# Altium footprint library FCI THD.PcbLib: 30 footprints (part 1 of 2) (continued)
## FCI_87606-310LF [mm] "20 Contacts - Pitch 2.54mm - Top Entry, Dual Row Through Mount Receptacle"
height 8.5
pads (20):
  round 1.6 hole 0.9: 1(-11.43,1.27) 2(-11.43,-1.27) 3(-8.89,1.27) 4(-8.89,-1.27) 5(-6.35,1.27) 6(-6.35,-1.27) 7(-3.81,1.27) 8(-3.81,-1.27) 9(-1.27,1.27) 10(-1.27,-1.27) 11(1.27,1.27) 12(1.27,-1.27) 13(3.81,1.27) 14(3.81,-1.27) 15(6.35,1.27) 16(6.35,-1.27) 17(8.89,1.27) 18(8.89,-1.27) 19(11.43,1.27) 20(11.43,-1.27)
Top Overlay:
  circle w0.3: c-11.357,3.048 r0.15
  lines w0.2: -12.66,-2.54 -12.66,2.54 12.66,2.54 12.66,-2.54 -12.66,-2.54
  text "20" at 13.081,-1.651 h1.02
  text "1" at -13.462,0.762 h1.02
Mechanical 14:
  drawing of 244 lines, arcs and shapes, not listed
  text "20" at 13.081,-1.651 h1.02
  text "1" at -13.462,0.762 h1.02
3D body "FCI_87606-310LF.stp": height 8.5, standoff -2.9, extent -12.7,-2.54 12.7,2.54

## FCI_87606-313LF [mm] "26 Contacts - Pitch 2.54mm - Top Entry, Dual Row Through Mount Receptacle"
height 8.5
pads (26):
  round 1.6 hole 0.9: 1(-15.24,1.27) 2(-15.24,-1.27) 3(-12.7,1.27) 4(-12.7,-1.27) 5(-10.16,1.27) 6(-10.16,-1.27) 7(-7.62,1.27) 8(-7.62,-1.27) 9(-5.08,1.27) 10(-5.08,-1.27) 11(-2.54,1.27) 12(-2.54,-1.27) 13(0,1.27) 14(0,-1.27) 15(2.54,1.27) 16(2.54,-1.27) 17(5.08,1.27) 18(5.08,-1.27) 19(7.62,1.27) 20(7.62,-1.27) 21(10.16,1.27) 22(10.16,-1.27) 23(12.7,1.27) 24(12.7,-1.27) 25(15.24,1.27) 26(15.24,-1.27)
Top Overlay:
  circle w0.3: c-15.167,3.048 r0.15
  lines w0.2: -16.47,-2.54 -16.47,2.54 16.47,2.54 16.47,-2.54 -16.47,-2.54
  text "26" at 16.891,-1.651 h1.02
  text "1" at -17.272,0.762 h1.02
Mechanical 14:
  drawing of 316 lines, arcs and shapes, not listed
  text "1" at -17.272,0.762 h1.02
  text "26" at 16.891,-1.651 h1.02
3D body "FCI_87606-313LF.stp": height 8.5, standoff -2.9, extent -16.51,-2.54 16.51,2.54

## FCI_87606-317LF [mm] "34 Contacts - Pitch 2.54mm - Top Entry, Dual Row Through Mount Receptacle"
height 8.5
pads (34):
  round 1.6 hole 0.9: 1(-20.32,1.27) 2(-20.32,-1.27) 3(-17.78,1.27) 4(-17.78,-1.27) 5(-15.24,1.27) 6(-15.24,-1.27) 7(-12.7,1.27) 8(-12.7,-1.27) 9(-10.16,1.27) 10(-10.16,-1.27) 11(-7.62,1.27) 12(-7.62,-1.27) 13(-5.08,1.27) 14(-5.08,-1.27) 15(-2.54,1.27) 16(-2.54,-1.27) 17(0,1.27) 18(0,-1.27) 19(2.54,1.27) 20(2.54,-1.27) 21(5.08,1.27) 22(5.08,-1.27) 23(7.62,1.27) 24(7.62,-1.27) 25(10.16,1.27) 26(10.16,-1.27) 27(12.7,1.27) 28(12.7,-1.27) 29(15.24,1.27) 30(15.24,-1.27) 31(17.78,1.27) 32(17.78,-1.27) 33(20.32,1.27) 34(20.32,-1.27)
Top Overlay:
  circle w0.3: c-20.247,3.048 r0.15
  lines w0.2: -21.55,-2.54 21.55,-2.54 21.55,2.54 -21.55,2.54 -21.55,-2.54
  text "34" at 21.971,-1.651 h1.02
  text "1" at -22.352,0.762 h1.02
Mechanical 14:
  drawing of 413 lines, arcs and shapes, not listed
  text "34" at 21.971,-1.651 h1.02
  text "1" at -22.352,0.762 h1.02
3D body "FCI_87606-317LF.stp": height 8.5, standoff -2.9, extent -21.59,-2.54 21.59,2.54

## FCI_87606-320LF [mm] "40 Contacts - Pitch 2.54mm - Top Entry, Dual Row Through Mount Receptacle"
height 8.5
pads (40):
  round 1.6 hole 0.9: 1(-24.13,1.27) 2(-24.13,-1.27) 3(-21.59,1.27) 4(-21.59,-1.27) 5(-19.05,1.27) 6(-19.05,-1.27) 7(-16.51,1.27) 8(-16.51,-1.27) 9(-13.97,1.27) 10(-13.97,-1.27) 11(-11.43,1.27) 12(-11.43,-1.27) 13(-8.89,1.27) 14(-8.89,-1.27) 15(-6.35,1.27) 16(-6.35,-1.27) 17(-3.81,1.27) 18(-3.81,-1.27) 19(-1.27,1.27) 20(-1.27,-1.27) 21(1.27,1.27) 22(1.27,-1.27) 23(3.81,1.27) 24(3.81,-1.27) 25(6.35,1.27) 26(6.35,-1.27) 27(8.89,1.27) 28(8.89,-1.27) 29(11.43,1.27) 30(11.43,-1.27) 31(13.97,1.27) 32(13.97,-1.27) 33(16.51,1.27) 34(16.51,-1.27) 35(19.05,1.27) 36(19.05,-1.27) 37(21.59,1.27) 38(21.59,-1.27) 39(24.13,1.27) 40(24.13,-1.27)
Top Overlay:
  circle w0.3: c-24.057,3.048 r0.15
  lines w0.2: -25.36,-2.54 25.36,-2.54 25.36,2.54 -25.36,2.54 -25.36,-2.54
  text "1" at -26.162,0.762 h1.02
  text "40" at 25.781,-1.651 h1.02
Mechanical 14:
  drawing of 485 lines, arcs and shapes, not listed
  text "1" at -26.162,0.762 h1.02
  text "40" at 25.781,-1.651 h1.02
3D body "FCI_87606-320LF.stp": height 8.5, standoff -2.9, extent -25.4,-2.54 25.4,2.54

## FCI_87606-325LF [mm] "50 Contacts - Pitch 2.54mm - Top Entry, Dual Row Through Mount Receptacle"
height 8.5
pads (50):
  round 1.6 hole 0.9: 1(-30.48,1.27) 2(-30.48,-1.27) 3(-27.94,1.27) 4(-27.94,-1.27) 5(-25.4,1.27) 6(-25.4,-1.27) 7(-22.86,1.27) 8(-22.86,-1.27) 9(-20.32,1.27) 10(-20.32,-1.27) 11(-17.78,1.27) 12(-17.78,-1.27) 13(-15.24,1.27) 14(-15.24,-1.27) 15(-12.7,1.27) 16(-12.7,-1.27) 17(-10.16,1.27) 18(-10.16,-1.27) 19(-7.62,1.27) 20(-7.62,-1.27) 21(-5.08,1.27) 22(-5.08,-1.27) 23(-2.54,1.27) 24(-2.54,-1.27) 25(0,1.27) 26(0,-1.27) 27(2.54,1.27) 28(2.54,-1.27) 29(5.08,1.27) 30(5.08,-1.27) 31(7.62,1.27) 32(7.62,-1.27) 33(10.16,1.27) 34(10.16,-1.27) 35(12.7,1.27) 36(12.7,-1.27) 37(15.24,1.27) 38(15.24,-1.27) 39(17.78,1.27) 40(17.78,-1.27) 41(20.32,1.27) 42(20.32,-1.27) 43(22.86,1.27) 44(22.86,-1.27) 45(25.4,1.27) 46(25.4,-1.27) 47(27.94,1.27) 48(27.94,-1.27) 49(30.48,1.27) 50(30.48,-1.27)
Top Overlay:
  circle w0.3: c-30.407,3.048 r0.15
  lines w0.2: -31.71,-2.54 31.71,-2.54 31.71,2.54 -31.71,2.54 -31.71,-2.54
  text "1" at -32.512,0.762 h1.02
  text "50" at 32.131,-1.651 h1.02
Mechanical 14:
  drawing of 605 lines, arcs and shapes, not listed
  text "50" at 32.131,-1.651 h1.02
  text "1" at -32.512,0.761 h1.02
3D body "FCI_87606-325LF.stp": height 8.5, standoff -2.9, extent -31.85,-2.54 31.85,2.54

## FCI_95678-001LF [mm] "1 Port, 8 Positions Shielded Snap PEG, CAT5 RJ45 Horizontal Modular Jack"
height 13.99
pads (12):
  round 1.6 hole 0.9: 1(4.445,1.27) 2(3.175,-1.27) 3(1.905,1.27) 4(0.635,-1.27) 5(-0.635,1.27) 6(-1.905,-1.27) 7(-3.171,1.27) 8(-4.445,-1.27)
  round 1 hole 3.25 unplated mask+1.125: M1(-5.715,7.62) M2(5.715,7.62)
  round 2.3 hole 1.6: SHIELD(-7.745,10.67) SHIELD(7.745,10.67)
Top Overlay:
  lines w0.2: -8.17,9.231 -8.17,-3.35 8.17,-3.35 8.17,9.231 ; -8.17,12.109 -8.17,18.35 8.17,18.35 8.17,12.109 ; -1.27,15.586 1.27,15.586 ; -1.27,17.759 1.27,17.759 ; -1.27,18.35 -1.27,15.48 1.27,15.48 1.27,18.35
  text "1" at 6.03,0.6 h1.2
Mechanical 8:
  circle w0.05: c7.745,10.67 r1.15
  circle w0.05: c-7.745,10.67 r1.15
  circle w0.05: c3.175,-1.27 r0.8
  circle w0.05: c4.445,1.27 r0.8
  circle w0.05: c1.905,1.27 r0.8
  circle w0.05: c0.635,-1.27 r0.8
  circle w0.05: c-1.905,-1.27 r0.8
  circle w0.05: c-0.635,1.27 r0.8
  circle w0.05: c-3.175,1.27 r0.8
  circle w0.05: c-4.445,-1.27 r0.8
  circle w0.05: c4.445,1.27 r0.45
  circle w0.05: c1.905,1.27 r0.45
  circle w0.05: c3.175,-1.27 r0.45
  circle w0.05: c-0.635,1.27 r0.45
  circle w0.05: c0.635,-1.27 r0.45
  circle w0.05: c-3.175,1.27 r0.45
  circle w0.05: c-1.905,-1.27 r0.45
  circle w0.05: c-4.445,-1.27 r0.45
  circle w0.05: c-7.745,10.67 r0.8
  circle w0.05: c7.745,10.67 r0.8
  circle w0.05: c-5.715,7.62 r1.625
  circle w0.05: c5.715,7.62 r1.625
  lines w0.05: -7.745,11.17 -7.745,10.67 -7.245,10.67 ; -5.715,8.12 -5.715,7.62 -5.215,7.62 ; -4.445,-0.77 -4.445,-1.27 -3.945,-1.27 ; -3.175,1.77 -3.175,1.27 -2.675,1.27 ; -1.905,-0.77 -1.905,-1.27 -1.405,-1.27 ; -0.635,1.77 -0.635,1.27 -0.135,1.27 ; -0.5,0 0,0 ; 0,-0.5 0,0 ; 0,0.5 0,0 ; 0.5,0 0,0 ; 0.635,-0.77 0.635,-1.27 1.135,-1.27 ; 1.905,1.77 1.905,1.27 2.405,1.27 ; 3.175,-0.77 3.175,-1.27 3.675,-1.27 ; 4.445,1.77 4.445,1.27 4.945,1.27 ; 5.715,8.12 5.715,7.62 6.215,7.62 ; 7.745,11.17 7.745,10.67 8.245,10.67
Mechanical 14:
  lines w0.1: -1.27,15.586 1.27,15.586 ; -1.27,17.759 1.27,17.759 ; -1.27,18.35 -1.27,15.48 1.27,15.48 1.27,18.35 ; -8.17,-3.35 8.17,-3.35 8.17,18.35 -8.17,18.35 -8.17,-3.35
  text "1" at 6.03,0.6 h1.2
3D body "FCI_95678-001LF.stp": height 15.27, standoff -4.06, extent -8.17,-3.35 8.17,18.35

## FCI_10074141-001LF [mm] "1.27mm (.050\") Pitch, eSATA Right-Angle, Upright Plug, Through-Hole Solder"
height 19.6
pads (11):
  round 1.1 hole 0.75: 1(0.5,-1.79) 2(-0.5,-0.52) 3(-0.5,0.75) 4(0.5,2.02) 5(-0.5,3.29) 6(-0.5,4.56) 7(0.5,5.83)
  round 2.05 hole 1.7: 8(-2.2,-3.75) 8(-2.2,3.75) 8(2.2,-3.75) 8(2.2,3.75)
Top Overlay:
  lines w0.2: -3.853,-12.9 -2.493,-12.9 ccw(c-2.619,-12.321) -2.04,-12.447 -2.04,-12.287 ; -3.293,-7.8 -3.293,-4.624 ; -3.293,-7.593 -2.333,-7.593 ; -3.293,-6.287 -2.333,-6.287 ; -3.293,-2.876 -3.293,2.723 ; -3.293,4.777 -3.293,7.02 3.293,7.02 3.293,4.777 ; -2.653,-12.9 -2.653,-13.3 -3.853,-13.3 -3.853,-12.58 -2.493,-12.58 ccw(c-2.493,-12.42) -2.333,-12.42 -2.333,-5.144 ; -2.333,-12.287 -1.907,-12.287 cw(c-1.907,-12.447) -1.747,-12.447 ; -2.333,-10.927 -2.561,-10.813 -2.333,-10.5 ; -2.333,-2.356 -2.333,2.256 ; -2.333,5.244 -2.333,7.02 ; -1.747,-12.447 -1.747,-12.9 1.747,-12.9 1.747,-12.447 ; 1.747,-12.447 cw(c1.907,-12.447) 1.907,-12.287 2.333,-12.287 ; 2.04,-12.287 2.04,-12.447 ccw(c2.619,-12.321) 2.493,-12.9 3.853,-12.9 ; 2.333,-10.927 2.561,-10.813 2.333,-10.5 ; 2.333,-7.593 3.293,-7.593 ; 2.333,-6.287 3.293,-6.287 ; 2.333,-5.244 2.333,-12.42 ccw(c2.493,-12.42) 2.493,-12.58 3.853,-12.58 3.853,-13.3 2.653,-13.3 2.653,-12.9 ; 2.333,-2.256 2.333,2.256 ; 2.333,5.244 2.333,7.02 ; 3.293,-7.8 3.293,-4.777 ; 3.293,-2.723 3.293,2.723 ; -3.293,-7.807 -2.333,-7.807 -3.293,-7.807 ; 2.333,-7.807 3.293,-7.807 2.333,-7.807
Mechanical 8:
  lines w0.1: -2.7,-3.75 -2.2,-3.75 ; -2.7,3.75 -2.2,3.75 ; -2.2,-4.25 -2.2,-3.75 ; -2.2,-3.25 -2.2,-3.75 ; -2.2,3.25 -2.2,3.75 ; -2.2,4.25 -2.2,3.75 ; -1.7,-3.75 -2.2,-3.75 ; -1.7,3.75 -2.2,3.75 ; -1,-0.52 -0.5,-0.52 -0.5,-1.02 ; -1,0.75 -0.5,0.75 -0.5,1.25 ; -1,3.29 -0.5,3.29 -0.5,3.79 ; -1,4.56 -0.5,4.56 -0.5,5.06 ; -0.5,0 0,0 ; 0,-0.5 0,0 ; 0,0.5 0,0 ; 0,5.83 0.5,5.83 0.5,6.33 ; 0.5,-2.29 0.5,-1.79 1,-1.79 ; 0.5,0 0,0 ; 0.5,1.52 0.5,2.02 1,2.02 ; 1.7,-3.75 2.2,-3.75 ; 1.7,3.75 2.2,3.75 ; 2.2,-4.25 2.2,-3.75 ; 2.2,-3.25 2.2,-3.75 ; 2.2,3.25 2.2,3.75 ; 2.2,4.25 2.2,3.75 ; 2.7,-3.75 2.2,-3.75 ; 2.7,3.75 2.2,3.75
Mechanical 14:
  lines w0.1: -3.853,-12.9 -2.493,-12.9 ccw(c-2.619,-12.321) -2.04,-12.447 -2.04,-12.287 ; -3.293,-7.807 -2.333,-7.807 ; -3.293,-7.8 -3.293,7.02 3.293,7.02 3.293,-7.8 ; -3.293,-7.593 -2.333,-7.593 ; -3.293,-6.287 -2.333,-6.287 ; -2.653,-12.9 -2.653,-13.3 -3.853,-13.3 -3.853,-12.58 -2.493,-12.58 ccw(c-2.493,-12.42) -2.333,-12.42 -2.333,7.02 ; -2.333,-12.287 -1.907,-12.287 cw(c-1.907,-12.447) -1.747,-12.447 ; -2.333,-10.927 -2.561,-10.813 -2.333,-10.5 ; -1.747,-12.447 -1.747,-12.9 1.747,-12.9 1.747,-12.447 ; 1.747,-12.447 cw(c1.907,-12.447) 1.907,-12.287 2.333,-12.287 ; 2.04,-12.287 2.04,-12.447 ccw(c2.619,-12.321) 2.493,-12.9 3.853,-12.9 ; 2.333,-10.927 2.561,-10.813 2.333,-10.5 ; 2.333,-7.807 3.293,-7.807 ; 2.333,-7.593 3.293,-7.593 ; 2.333,-6.287 3.293,-6.287 ; 2.333,7.02 2.333,-12.42 ccw(c2.493,-12.42) 2.493,-12.58 3.853,-12.58 3.853,-13.3 2.653,-13.3 2.653,-12.9
3D body "FCI_10074141-001LF.stp": height 19.15, standoff -2.91, extent -3.85,-13.25 3.85,7.02

## FCI_20020110-D041A01LF [mm] "10A, 300V, 4 Positions, Pitch 3.81mm, Right Angled Terminal Block"
height 7.5
pads (4):
  round 2.1 hole 1.4: 1(-5.715,0) 2(-1.905,0) 3(1.905,0) 4(5.715,0)
Top Overlay:
  circle w0.5: c-5.725,2.3 r0.25
  lines w0.2: -8.115,-7.8 -8.115,1.4 8.115,1.4 8.115,-7.8 ; -8.115,-5.4 -8.215,-5.4 -8.215,-7.8 8.215,-7.8 8.215,-5.4 8.115,-5.4
  text "1" at -5.985,-2.975 h1.2
Mechanical 8:
  lines w0.1: -6.215,0 -5.715,0 ; -5.715,-0.5 -5.715,0 ; -5.715,0.5 -5.715,0 ; -5.215,0 -5.715,0 ; -2.405,0 -1.905,0 ; -1.905,-0.5 -1.905,0 ; -1.905,0.5 -1.905,0 ; -1.405,0 -1.905,0 ; -0.5,0 0,0 ; 0,-0.5 0,0 ; 0,0.5 0,0 ; 0.5,0 0,0 ; 1.405,0 1.905,0 ; 1.905,-0.5 1.905,0 ; 1.905,0.5 1.905,0 ; 2.405,0 1.905,0 ; 5.215,0 5.715,0 ; 5.715,-0.5 5.715,0 ; 5.715,0.5 5.715,0 ; 6.215,0 5.715,0
Mechanical 14:
  lines w0.1: -8.115,-7.8 -8.115,1.4 8.115,1.4 8.115,-7.8 ; -8.115,-5.4 -8.215,-5.4 -8.215,-7.8 8.215,-7.8 8.215,-5.4 8.115,-5.4
  text "1" at -5.985,-2.975 h1.2
3D body "FCI_20020110-D041A01LF.stp": height 7.6, standoff -3.52, extent -8.215,-7.8 8.215,1.4

## FCI_20021311-00010T4LF [mm] "10 Contacts, Pitch 1.27mm, Board-To-Board Connector, THD Vertical Receptacle, Minitek127 20021311 Series"
height 4.4
pads (10):
  rrect50% 1.05x1.05 hole 0.6: 1(-2.54,-0.635) 2(-2.54,0.635) 3(-1.27,-0.635) 4(-1.27,0.635) 5(0,-0.635) 6(0,0.635) 7(1.27,-0.635) 8(1.27,0.635) 9(2.54,-0.635) 10(2.54,0.635)
Top Overlay:
  circle w0.25: c-2.575,-1.975 r0.125
  lines w0.2: -3.41,1.5 -3.135,1.5 ; -3.4,-1.237 -3.4,-1.5 -3.135,-1.5 ; -3.4,1.237 -3.4,1.5 ; 3.135,-1.5 3.4,-1.5 ; 3.135,1.5 3.41,1.5 3.41,1.223 ; 3.41,-1.5 3.41,-1.223
Mechanical 8:
  lines w0.05: -3.04,-0.635 -2.54,-0.635 ; -3.04,0.635 -2.54,0.635 ; -2.54,-1.135 -2.54,-0.635 ; -2.54,-0.135 -2.54,-0.635 ; -2.54,0.135 -2.54,0.635 ; -2.54,1.135 -2.54,0.635 ; -2.04,-0.635 -2.54,-0.635 ; -2.04,0.635 -2.54,0.635 ; -1.77,-0.635 -1.27,-0.635 ; -1.77,0.635 -1.27,0.635 ; -1.27,-1.135 -1.27,-0.635 ; -1.27,-0.135 -1.27,-0.635 ; -1.27,0.135 -1.27,0.635 ; -1.27,1.135 -1.27,0.635 ; -0.77,-0.635 -1.27,-0.635 ; -0.77,0.635 -1.27,0.635 ; -0.5,-0.635 0,-0.635 ; -0.5,0 0,0 ; -0.5,0.635 0,0.635 ; 0,-1.135 0,-0.635 ; 0,1.135 0,0.635 ; 0.5,-0.635 0,-0.635 ; 0.5,0 0,0 ; 0.5,0.635 0,0.635 ; 0.77,-0.635 1.27,-0.635 ; 0.77,0.635 1.27,0.635 ; 1.27,-1.135 1.27,-0.635 ; 1.27,-0.135 1.27,-0.635 ; 1.27,0.135 1.27,0.635 ; 1.27,1.135 1.27,0.635 ; 1.77,-0.635 1.27,-0.635 ; 1.77,0.635 1.27,0.635 ; 2.04,-0.635 2.54,-0.635 ; 2.04,0.635 2.54,0.635 ; 2.54,-1.135 2.54,-0.635 ; 2.54,-0.135 2.54,-0.635 ; 2.54,0.135 2.54,0.635 ; 2.54,1.135 2.54,0.635 ; 3.04,-0.635 2.54,-0.635 ; 3.04,0.635 2.54,0.635 ; 0,-0.635 0,0 ; 0,0 0,0.635
Mechanical 14:
  circle w0.1: c-2.575,-1.975 r0.125
  lines w0.1: -3.02,-1.115 -3.02,-0.155 ; -3.02,-1.115 -2.06,-1.115 ; -3.02,-1.115 -2.79,-0.885 ; -3.02,-0.155 -2.06,-0.155 ; -3.02,-0.155 -2.79,-0.385 ; -3.02,0.155 -2.06,0.155 ; -3.02,0.155 -3.02,1.115 ; -3.02,0.155 -2.79,0.385 ; -3.02,1.115 -2.06,1.115 ; -3.02,1.115 -2.79,0.885 ; -2.79,-0.885 -2.79,-0.385 ; -2.79,-0.885 -2.29,-0.885 ; -2.79,-0.385 -2.29,-0.385 ; -2.79,0.385 -2.79,0.885 ; -2.79,0.385 -2.29,0.385 ; -2.79,0.885 -2.29,0.885 ; -2.29,-0.885 -2.29,-0.385 ; -2.29,-0.885 -2.06,-1.115 ; -2.29,-0.385 -2.06,-0.155 ; -2.29,0.385 -2.29,0.885 ; -2.29,0.385 -2.06,0.155 ; -2.29,0.885 -2.06,1.115 ; -2.06,-1.115 -2.06,-0.155 ; -2.06,0.155 -2.06,1.115 ; -1.75,-1.115 -1.75,-0.155 ; -1.75,-1.115 -0.79,-1.115 ; -1.75,-1.115 -1.52,-0.885 ; -1.75,-0.155 -0.79,-0.155 ; -1.75,-0.155 -1.52,-0.385 ; -1.75,0.155 -0.79,0.155 ; -1.75,0.155 -1.75,1.115 ; -1.75,0.155 -1.52,0.385 ; -1.75,1.115 -0.79,1.115 ; -1.75,1.115 -1.52,0.885 ; -1.52,-0.885 -1.52,-0.385 ; -1.52,-0.885 -1.02,-0.885 ; -1.52,-0.385 -1.02,-0.385 ; -1.52,0.385 -1.52,0.885 ; -1.52,0.385 -1.02,0.385 ; -1.52,0.885 -1.02,0.885 ; -1.02,-0.885 -1.02,-0.385 ; -1.02,-0.885 -0.79,-1.115 ; -1.02,-0.385 -0.79,-0.155 ; -1.02,0.385 -1.02,0.885 ; -1.02,0.385 -0.79,0.155 ; -1.02,0.885 -0.79,1.115 ; -0.79,-1.115 -0.79,-0.155 ; -0.79,0.155 -0.79,1.115 ; -0.48,-1.115 -0.48,-0.155 ; -0.48,-1.115 0.48,-1.115 ; -0.48,-1.115 -0.25,-0.885 ; -0.48,-0.155 0.48,-0.155 ; -0.48,-0.155 -0.25,-0.385 ; -0.48,0.155 0.48,0.155 ; -0.48,0.155 -0.48,1.115 ; -0.48,0.155 -0.25,0.385 ; -0.48,1.115 0.48,1.115 ; -0.48,1.115 -0.25,0.885 ; -0.25,-0.885 -0.25,-0.385 ; -0.25,-0.885 0.25,-0.885 ; -0.25,-0.385 0.25,-0.385 ; -0.25,0.385 -0.25,0.885 ; -0.25,0.385 0.25,0.385 ; -0.25,0.885 0.25,0.885 ; 0.25,-0.885 0.25,-0.385 ; 0.25,-0.885 0.48,-1.115 ; 0.25,-0.385 0.48,-0.155 ; 0.25,0.385 0.25,0.885 ; 0.25,0.385 0.48,0.155 ; 0.25,0.885 0.48,1.115 ; 0.48,-1.115 0.48,-0.155 ; 0.48,0.155 0.48,1.115 ; 0.79,-1.115 0.79,-0.155 ; 0.79,-1.115 1.75,-1.115 ; 0.79,-1.115 1.02,-0.885 ; 0.79,-0.155 1.75,-0.155 ; 0.79,-0.155 1.02,-0.385 ; 0.79,0.155 1.75,0.155 ; 0.79,0.155 0.79,1.115 ; 0.79,0.155 1.02,0.385 ; 0.79,1.115 1.75,1.115 ; 0.79,1.115 1.02,0.885 ; 1.02,-0.885 1.02,-0.385 ; 1.02,-0.885 1.52,-0.885 ; 1.02,-0.385 1.52,-0.385 ; 1.02,0.385 1.02,0.885 ; 1.02,0.385 1.52,0.385 ; 1.02,0.885 1.52,0.885 ; 1.52,-0.885 1.52,-0.385 ; 1.52,-0.885 1.75,-1.115 ; 1.52,-0.385 1.75,-0.155 ; 1.52,0.385 1.52,0.885 ; 1.52,0.385 1.75,0.155 ; 1.52,0.885 1.75,1.115 ; 1.75,-1.115 1.75,-0.155 ; 1.75,0.155 1.75,1.115 ; 2.06,-1.115 2.06,-0.155 ; 2.06,-1.115 3.02,-1.115 ; 2.06,-1.115 2.29,-0.885 ; 2.06,-0.155 3.02,-0.155 ; 2.06,-0.155 2.29,-0.385 ; 2.06,0.155 3.02,0.155 ; 2.06,0.155 2.06,1.115 ; 2.06,0.155 2.29,0.385 ; 2.06,1.115 3.02,1.115 ; 2.06,1.115 2.29,0.885 ; 2.29,-0.885 2.29,-0.385 ; 2.29,-0.885 2.79,-0.885 ; 2.29,-0.385 2.79,-0.385 ; 2.29,0.385 2.29,0.885 ; 2.29,0.385 2.79,0.385 ; 2.29,0.885 2.79,0.885 ; 2.79,-0.885 2.79,-0.385 ; 2.79,-0.885 3.02,-1.115 ; 2.79,-0.385 3.02,-0.155 ; 2.79,0.385 2.79,0.885 ; 2.79,0.385 3.02,0.155 ; 2.79,0.885 3.02,1.115 ; 3.02,-1.115 3.02,-0.155 ; 3.02,0.155 3.02,1.115 ; -3.4,-1.5 -3.4,1.5 3.41,1.5 3.41,-1.5 -3.4,-1.5
3D body "FCI_20021311-00010T4LF.stp": height 4.3, standoff -2.4, extent -3.4,-1.5 3.41,1.5

## FCI_D09P13A4GV00LF [mm] "Right Angled D-SUB 9 Female Contacts for PCB  with Harpoons and Female Screwlock (UNC4-40) and Elec. Continuity"
height 13.86
pads (11):
  round 1.6 hole 0.9: 1(5.48,-1.27) 2(2.74,-1.27) 3(0,-1.27) 4(-2.74,-1.27) 5(-5.48,-1.27) 6(4.11,1.27) 7(1.37,1.27) 8(-1.37,1.27) 9(-4.11,1.27)
  round 3.9 hole 3.2: 10(-12.495,0) 11(12.495,0)
Top Overlay:
  circle w0.5: c5.5,-4.2 r0.25
  lines w0.2: -15.455,11.7 -15.455,11.2 15.445,11.2 15.445,11.7 ; -15.445,11.7 15.435,11.7 ; -15.405,7.95 -9.595,7.95 ; -15.405,8.25 15.405,8.25 ; -15.405,11.2 -15.405,-3.05 15.405,-3.05 15.405,11.2 ; -15.395,-0.2 ccw(c-12.895,-0.2) -12.895,-2.7 -12.095,-2.7 ccw(c-12.095,-0.2) -9.595,-0.2 -9.595,8.25 ; -14.745,11.7 -14.745,17.35 ; -14.245,7.95 -14.245,7.75 -10.745,7.75 -10.745,7.95 ; -10.245,11.7 -10.245,17.35 ; -9.553,11.7 ccw(c-9.553,12.4) -8.853,12.4 -8.853,17.1 cw(c-8.353,17.1) -8.353,17.6 8.343,17.6 cw(c8.343,17.1) 8.843,17.1 8.843,12.4 ccw(c9.543,12.4) 9.543,11.7 ; -8.48,-3.05 -8.48,8.25 ; 8.48,-3.05 8.48,8.25 ; 9.595,7.95 15.395,7.95 ; 9.595,8.25 9.595,-0.2 ccw(c12.104,-0.196) 11.943,-2.7 12.895,-2.7 ccw(c12.895,-0.2) 15.395,-0.2 ; 10.245,11.7 10.245,17.35 ; 10.745,7.95 10.745,7.75 14.245,7.75 14.245,7.95 ; 14.745,11.7 14.745,17.35 ; -14.745,17.35 -10.245,17.35 ; -14.745,17.35 -14.245,17.85 -10.745,17.85 -10.245,17.35 ; 10.245,17.35 14.745,17.35 ; 10.245,17.35 10.745,17.85 14.245,17.85 14.745,17.35
  text "5" at -7.775,-1.9 h1.2
  text "6" at 6,0.775 h1.2
  text "9" at -6.7,0.775 h1.2
  text "1" at 7.175,-1.925 h1.2
Mechanical 8:
  lines w0.1: -12.995,0 -12.495,0 ; -12.495,-0.5 -12.495,0 ; -12.495,0.5 -12.495,0 ; -11.995,0 -12.495,0 ; -5.98,-1.27 -5.48,-1.27 ; -5.48,-1.77 -5.48,-1.27 ; -5.48,-0.77 -5.48,-1.27 ; -4.98,-1.27 -5.48,-1.27 ; -4.61,1.27 -4.11,1.27 ; -4.11,0.77 -4.11,1.27 ; -4.11,1.77 -4.11,1.27 ; -3.61,1.27 -4.11,1.27 ; -3.24,-1.27 -2.74,-1.27 ; -2.74,-1.77 -2.74,-1.27 ; -2.74,-0.77 -2.74,-1.27 ; -2.24,-1.27 -2.74,-1.27 ; -1.87,1.27 -1.37,1.27 ; -1.37,0.77 -1.37,1.27 ; -1.37,1.77 -1.37,1.27 ; -0.87,1.27 -1.37,1.27 ; -0.5,-1.27 0,-1.27 ; -0.354,-0.354 0,0 ; -0.354,0.354 0,0 ; 0,-1.77 0,-1.27 ; 0,-0.77 0,-1.27 ; 0.354,-0.354 0,0 ; 0.354,0.354 0,0 ; 0.5,-1.27 0,-1.27 ; 0.87,1.27 1.37,1.27 ; 1.37,0.77 1.37,1.27 ; 1.37,1.77 1.37,1.27 ; 1.87,1.27 1.37,1.27 ; 2.24,-1.27 2.74,-1.27 ; 2.74,-1.77 2.74,-1.27 ; 2.74,-0.77 2.74,-1.27 ; 3.24,-1.27 2.74,-1.27 ; 3.61,1.27 4.11,1.27 ; 4.11,0.77 4.11,1.27 ; 4.11,1.77 4.11,1.27 ; 4.61,1.27 4.11,1.27 ; 4.98,-1.27 5.48,-1.27 ; 5.48,-1.77 5.48,-1.27 ; 5.48,-0.77 5.48,-1.27 ; 5.98,-1.27 5.48,-1.27 ; 11.995,0 12.495,0 ; 12.495,-0.5 12.495,0 ; 12.495,0.5 12.495,0 ; 12.995,0 12.495,0
Mechanical 14:
  circle w0.1: c12.495,0 r1.325
  circle w0.1: c-12.495,0 r1.325
  lines w0.1: -15.455,11.7 -15.455,11.2 15.445,11.2 15.445,11.7 ; -15.445,11.7 15.435,11.7 ; -15.405,7.95 -9.595,7.95 ; -15.405,8.25 15.405,8.25 ; -15.405,11.2 -15.405,-3.05 15.405,-3.05 15.405,11.2 ; -15.395,-0.2 ccw(c-12.895,-0.2) -12.895,-2.7 -12.095,-2.7 ccw(c-12.095,-0.2) -9.595,-0.2 -9.595,8.25 ; -14.745,11.7 -14.745,17.35 ; -14.245,7.95 -14.245,7.75 -10.745,7.75 -10.745,7.95 ; -10.245,11.7 -10.245,17.35 ; -9.553,11.7 ccw(c-9.553,12.4) -8.853,12.4 -8.853,17.1 cw(c-8.353,17.1) -8.353,17.6 8.343,17.6 cw(c8.343,17.1) 8.843,17.1 8.843,12.4 ccw(c9.543,12.4) 9.543,11.7 ; -8.48,-3.05 -8.48,8.25 ; 8.48,-3.05 8.48,8.25 ; 9.595,7.95 15.395,7.95 ; 9.595,8.25 9.595,-0.2 ccw(c12.104,-0.196) 11.943,-2.7 12.895,-2.7 ccw(c12.895,-0.2) 15.395,-0.2 ; 10.245,11.7 10.245,17.35 ; 10.745,7.95 10.745,7.75 14.245,7.75 14.245,7.95 ; 14.745,11.7 14.745,17.35 ; -14.745,17.35 -10.245,17.35 ; -14.745,17.35 -14.245,17.85 -10.745,17.85 -10.245,17.35 ; 10.245,17.35 14.745,17.35 ; 10.245,17.35 10.745,17.85 14.245,17.85 14.745,17.35
  text "9 D-Sub Male" at -6.028,3.022 h1.2
  text "5" at -7.775,-1.9 h1.2
  text "6" at 6,0.775 h1.2
  text "9" at -6.7,0.775 h1.2
  text "1" at 7.175,-1.925 h1.2
3D body "FCI_D09P13A4GV00LF.stp": height 13.45, standoff -3.18, extent -15.455,-3.05 15.445,17.85

## FCI_D09P24A4GV00LF [mm] "Straight D-SUB 9 Male Contacts for PCB  with Harpoons and Female Screwlock (UNC4-40) and Elec. Continuity"
height 12.25
pads (11):
  round 1.6 hole 0.9: 1(-5.48,1.42) 2(-2.74,1.42) 3(0,1.42) 4(2.74,1.42) 5(5.48,1.42) 6(-4.11,-1.42) 7(-1.37,-1.42) 8(1.37,-1.42) 9(4.11,-1.42)
  round 3.9 hole 3.2: 10(-12.495,0) 11(12.495,0)
Top Overlay:
  circle w0.5: c-5.48,7.42 r0.25
  lines w0.2: -15.595,-4.75 ccw(c-13.995,-4.75) -13.995,-6.35 13.995,-6.35 ccw(c13.995,-4.75) 15.595,-4.75 15.595,4.75 ccw(c13.995,4.75) 13.995,6.35 -13.995,6.35 ccw(c-13.995,4.75) -15.595,4.75 -15.595,-4.75 ; -8.928,0.978 cw(c-5.855,1.52) -5.855,4.64 5.955,4.64 cw(c5.955,1.52) 9.028,0.978 8.469,-2.192 cw(c5.396,-1.65) 5.396,-4.77 -5.296,-4.77 cw(c-5.296,-1.65) -8.369,-2.192 -8.928,0.978
  text "6" at -6.46,-2.17 h1.2
  text "5" at 6.93,0.695 h1.2
  text "1" at -7.505,0.67 h1.2
  text "9" at 5.535,-2.17 h1.2
Mechanical 8:
  lines w0.2: -1,0 0,0 0,-1
Mechanical 14:
  circle w0.1: c-12.495,0 r2.25
  circle w0.1: c12.495,0 r2.25
  lines w0.1: -15.595,-4.75 ccw(c-13.995,-4.75) -13.995,-6.35 13.995,-6.35 ccw(c13.995,-4.75) 15.595,-4.75 15.595,4.75 ccw(c13.995,4.75) 13.995,6.35 -13.995,6.35 ccw(c-13.995,4.75) -15.595,4.75 -15.595,-4.75 ; -8.928,0.978 cw(c-5.855,1.52) -5.855,4.64 5.955,4.64 cw(c5.955,1.52) 9.028,0.978 8.469,-2.192 cw(c5.396,-1.65) 5.396,-4.77 -5.296,-4.77 cw(c-5.296,-1.65) -8.369,-2.192 -8.928,0.978 ; -8.435,1.065 cw(c-5.855,1.52) -5.855,4.14 5.955,4.14 cw(c5.955,1.52) 8.535,1.065 7.976,-2.105 cw(c5.396,-1.65) 5.396,-4.27 -5.296,-4.27 cw(c-5.296,-1.65) -7.876,-2.105 -8.435,1.065
  text "9" at 5.535,-2.17 h1.2
  text "1" at -7.505,0.67 h1.2
  text "5" at 6.93,0.695 h1.2
  text "6" at -6.46,-2.17 h1.2
  text "9 D-Sub Male" at -6.053,4.872 h1.2
3D body "FCI_D09P24A4GV00LF.stp": height 12, standoff -3, extent -15.495,-6.275 15.495,6.275